# Altium footprint library Universal components.PcbLib: 101 footprints (part 3 of 7)
Each footprint in its own frame and in the unit in brackets; x right, y up, seen from the top. Pads: shape width x height; smd on the part's side, far side on the other; paste and mask are expansions set on the pad; w line width, h text height; cw(c..) or ccw(c..) is an arc to the next point about the centre after c.
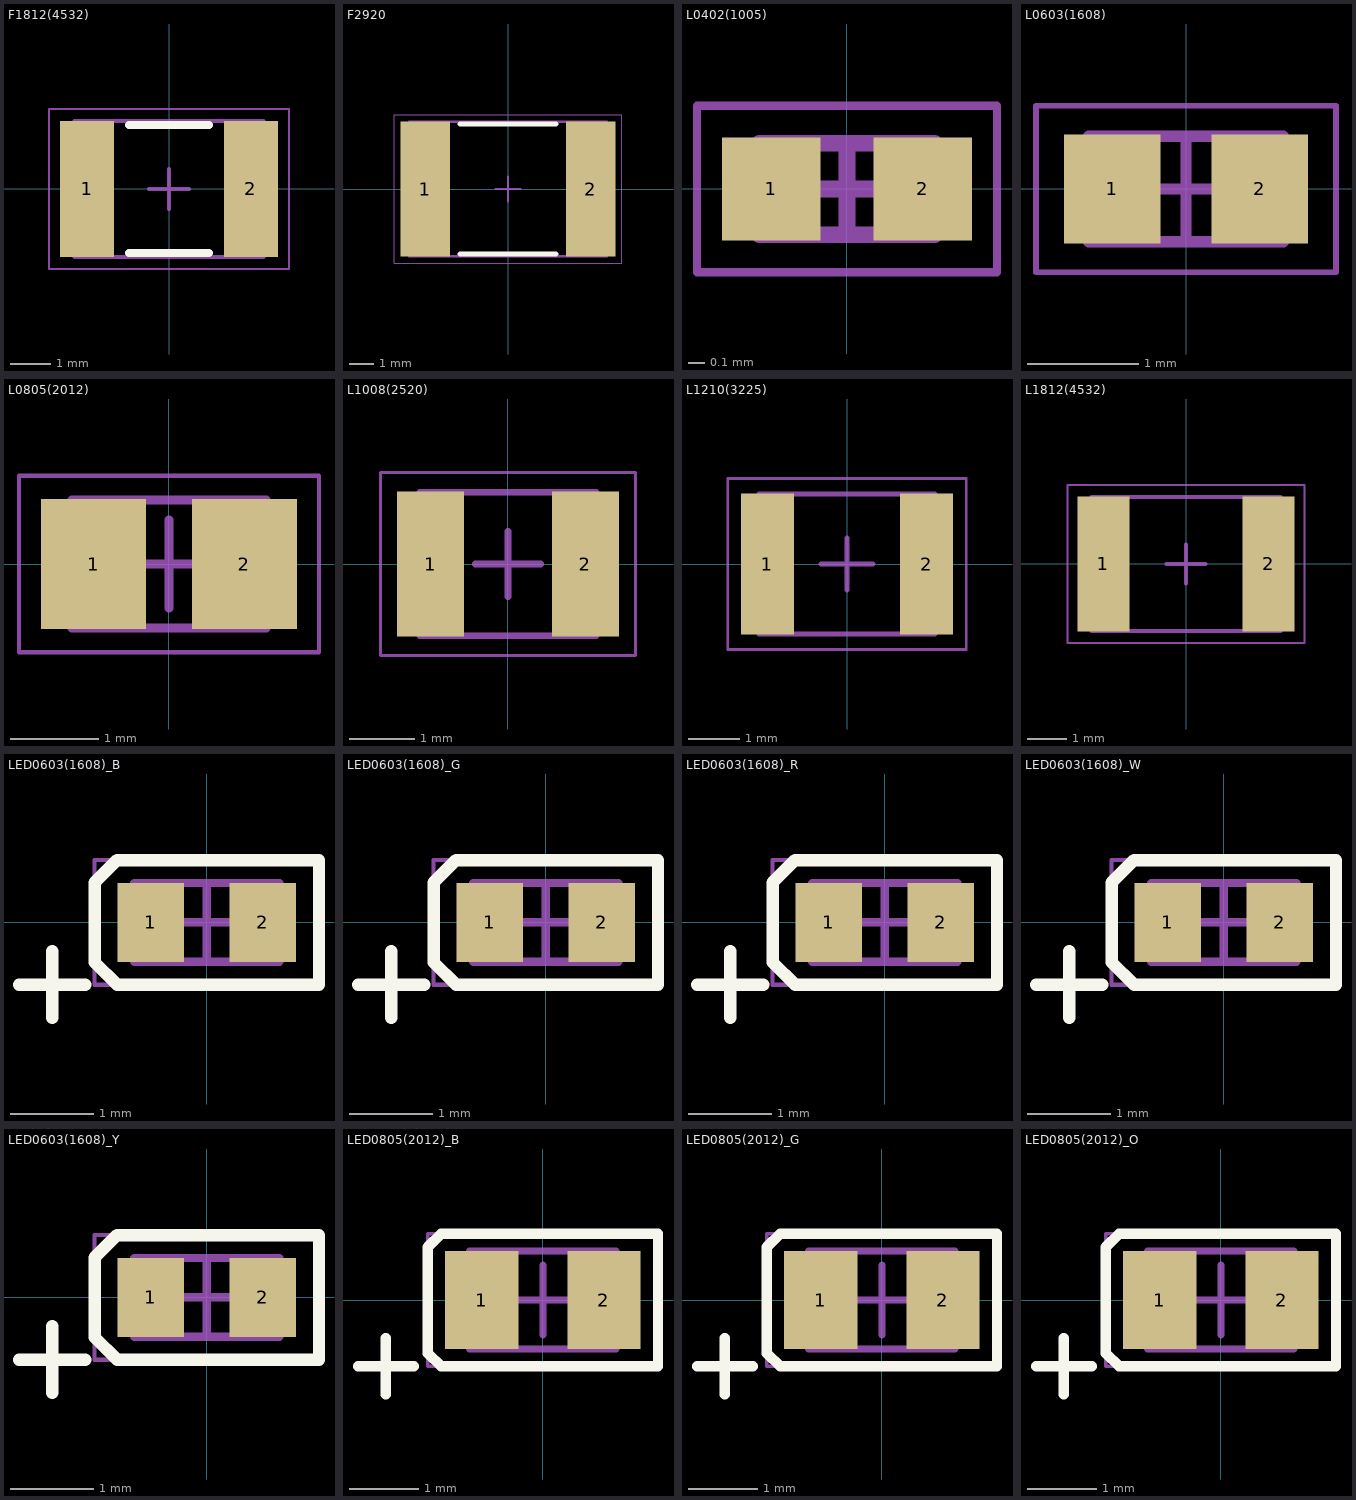
[diagram p2: the footprints below, top view; thin cyan lines are the x and y axes]

## F1812(4532) [mm] "Chip Fuse, 2-Leads, Body 4.55x3.24mm, IPC Medium Density"
height 1.2
pads (2):
  rect 1.35x3.4 smd: 1(-2.05,0) 2(2.05,0)
Top Overlay:
  lines w0.2: -1,-1.6 1,-1.6 ; -1,1.6 1,1.6
Mechanical 13:
  lines w0.1: -2.365,-1.705 2.365,-1.705 2.365,1.705 -2.365,1.705 -2.365,-1.705
Mechanical 15:
  lines w0.05: -3,-2 3,-2 3,2 -3,2 -3,-2
  lines w0.1: -0.5,0 0.5,0 ; 0,-0.5 0,0.5
3D body "User Library-Fuse 1812.step": height 1.03, standoff 0, extent -2.365,-1.74 2.37,1.74

## F2920 [mm] "Chip Fuse, 2-Leads, Body 7.36x5.12mm, IPC Medium Density"
height 1.2
pads (2):
  rect 2x5.45 smd: 1(-3.35,0) 2(3.35,0)
Top Overlay:
  lines w0.2: -1.95,-2.625 1.95,-2.625 ; -1.95,2.625 1.95,2.625
Mechanical 13:
  lines w0.1: -3.99,-2.72 3.99,-2.72 3.99,2.72 -3.99,2.72 -3.99,-2.72
Mechanical 15:
  lines w0.05: -4.6,-3 4.6,-3 4.6,3 -4.6,3 -4.6,-3
  lines w0.1: -0.5,0 0.5,0 ; 0,-0.5 0,0.5
3D body "User Library-0ZCF0200AF2C.step": height 0.8, standoff 0, extent -3.99,-2.72 3.99,2.72

## L0402(1005) [mm] "Chip Inductor, 2-Leads, Body 1.00x0.50mm, IPC Medium Density"
height 0.55
pads (2):
  rect 0.59x0.62 smd: 1(-0.455,0) 2(0.455,0)
Mechanical 13:
  lines w0.1: -0.525,-0.275 -0.525,0.275 0.525,0.275 0.525,-0.275 -0.525,-0.275
Mechanical 15:
  lines w0.05: -0.9,-0.5 -0.9,0.5 0.9,0.5 0.9,-0.5 -0.9,-0.5
  lines w0.1: -0.275,0 0.275,0 ; 0,-0.275 0,0.275
3D body "User Library-Chip InductorINDC1005X60N.STEP": height 0.6, standoff 0, extent -0.5,-0.25 0.5,0.25

## L0603(1608) [mm] "Chip Inductor, 2-Leads, Body 1.60x0.80mm, IPC Medium Density"
height 0.65
pads (2):
  rect 0.87x0.98 smd: 1(-0.665,0) 2(0.665,0)
Mechanical 13:
  lines w0.1: -0.875,-0.475 0.875,-0.475 0.875,0.475 -0.875,0.475 -0.875,-0.475
Mechanical 15:
  lines w0.05: -1.35,-0.75 1.35,-0.75 1.35,0.75 -1.35,0.75 -1.35,-0.75
  lines w0.1: -0.475,0 0.475,0 ; 0,-0.475 0,0.475
3D body "User Library-Chip InductorINDC1608X95N.STEP": height 0.95, standoff 0, extent -0.8,-0.4 0.8,0.4

## L0805(2012) [mm] "Chip Inductor, 2-Leads, Body 2.00x1.25mm, IPC Medium Density"
height 1.45
pads (2):
  rect 1.19x1.47 smd: 1(-0.855,0) 2(0.855,0)
Mechanical 13:
  lines w0.1: -1.1,-0.725 -1.1,0.725 1.1,0.725 1.1,-0.725 -1.1,-0.725
Mechanical 15:
  lines w0.05: -1.7,-1 -1.7,1 1.7,1 1.7,-1 -1.7,-1
  lines w0.1: -0.5,0 0.5,0 ; 0,-0.5 0,0.5
3D body "User Library-Chip InductorINDC2012X130N.STEP": height 1.3, standoff 0, extent -1,-0.6 1,0.6

## L1008(2520) [mm] "Chip Inductor, 2-Leads, Body 2.50x2.00mm, IPC Medium Density"
height 1.7
pads (2):
  rect 1.03x2.22 smd: 1(-1.185,0) 2(1.185,0)
Mechanical 13:
  lines w0.1: -1.35,-1.1 -1.35,1.1 1.35,1.1 1.35,-1.1 -1.35,-1.1
Mechanical 15:
  lines w0.05: -1.95,-1.4 -1.95,1.4 1.95,1.4 1.95,-1.4 -1.95,-1.4
  lines w0.1: -0.5,0 0.5,0 ; 0,-0.5 0,0.5
3D body "User Library-Chip InductorINDC2520X220N.STEP": height 2.2, standoff 0, extent -1.25,-1 1.25,1

## L1210(3225) [mm] "Chip Inductor, 2-Leads, Body 3.20x2.50mm, IPC Medium Density"
height 2.4
pads (2):
  rect 1.03x2.72 smd: 1(-1.535,0) 2(1.535,0)
Mechanical 13:
  lines w0.1: -1.7,-1.35 -1.7,1.35 1.7,1.35 1.7,-1.35 -1.7,-1.35
Mechanical 15:
  lines w0.05: -2.3,-1.65 -2.3,1.65 2.3,1.65 2.3,-1.65 -2.3,-1.65
  lines w0.1: -0.5,0 0.5,0 ; 0,-0.5 0,0.5
3D body "User Library-Chip InductorINDC3225X135N.STEP": height 1.35, standoff 0, extent -1.6,-1.25 1.6,1.25

## L1812(4532) [mm] "Chip Inductor, 2-Leads, Body 4.50x3.20mm, IPC Medium Density"
height 3.4
pads (2):
  rect 1.32x3.42 smd: 1(-2.095,0) 2(2.095,0)
Mechanical 13:
  lines w0.1: -2.4,-1.7 2.4,-1.7 2.4,1.7 -2.4,1.7 -2.4,-1.7
Mechanical 15:
  lines w0.05: -3,-2 3,-2 3,2 -3,2 -3,-2
  lines w0.1: -0.5,0 0.5,0 ; 0,-0.5 0,0.5
3D body "User Library-Chip InductorINDC4532X175N1.STEP": height 1.75, standoff 0, extent -2.25,-1.6 2.25,1.6

## LED0603(1608)_B [mm] "Chip Resistor, 2-Leads, Body 1.60x0.80mm, IPC Medium Density"
height 0.5
pads (2):
  rect 0.8x0.95 smd: 1(-0.675,0) 2(0.675,0)
Top Overlay:
  lines w0.15: -2.26,-0.75 -1.46,-0.75 ; -1.86,-1.15 -1.86,-0.35 ; -1.35,-0.48 -1.35,0.48 -1.08,0.75 1.35,0.75 1.35,-0.75 -1.08,-0.75 -1.35,-0.48
Mechanical 13:
  lines w0.1: -0.875,-0.475 -0.875,0.475 0.875,0.475 0.875,-0.475 -0.875,-0.475
Mechanical 15:
  lines w0.05: -1.35,-0.75 -1.35,0.75 1.35,0.75 1.35,-0.75 -1.35,-0.75
  lines w0.1: -0.475,0 0.475,0 ; 0,-0.475 0,0.475
3D body "User Library-LED_0603_B.STEP": height 0.6, standoff 0, extent -0.8,-0.4 0.8,0.4

## LED0603(1608)_G [mm] "Chip Resistor, 2-Leads, Body 1.60x0.80mm, IPC Medium Density"
height 0.5
pads (2):
  rect 0.8x0.95 smd: 1(-0.675,0) 2(0.675,0)
Top Overlay:
  lines w0.15: -2.26,-0.75 -1.46,-0.75 ; -1.86,-1.15 -1.86,-0.35 ; -1.35,-0.48 -1.35,0.48 -1.08,0.75 1.35,0.75 1.35,-0.75 -1.08,-0.75 -1.35,-0.48
Mechanical 13:
  lines w0.1: -0.875,-0.475 -0.875,0.475 0.875,0.475 0.875,-0.475 -0.875,-0.475
Mechanical 15:
  lines w0.05: -1.35,-0.75 -1.35,0.75 1.35,0.75 1.35,-0.75 -1.35,-0.75
  lines w0.1: -0.475,0 0.475,0 ; 0,-0.475 0,0.475
3D body "User Library-LED_0603_G.STEP": height 0.6, standoff 0, extent -0.8,-0.4 0.8,0.4

## LED0603(1608)_R [mm] "Chip Resistor, 2-Leads, Body 1.60x0.80mm, IPC Medium Density"
height 0.5
pads (2):
  rect 0.8x0.95 smd: 1(-0.675,0) 2(0.675,0)
Top Overlay:
  lines w0.15: -2.26,-0.75 -1.46,-0.75 ; -1.86,-1.15 -1.86,-0.35 ; -1.35,-0.48 -1.35,0.48 -1.08,0.75 1.35,0.75 1.35,-0.75 -1.08,-0.75 -1.35,-0.48
Mechanical 13:
  lines w0.1: -0.875,-0.475 -0.875,0.475 0.875,0.475 0.875,-0.475 -0.875,-0.475
Mechanical 15:
  lines w0.05: -1.35,-0.75 -1.35,0.75 1.35,0.75 1.35,-0.75 -1.35,-0.75
  lines w0.1: -0.475,0 0.475,0 ; 0,-0.475 0,0.475
3D body "User Library-LED_0603_R.STEP": height 0.6, standoff 0, extent -0.8,-0.4 0.8,0.4

## LED0603(1608)_W [mm] "Chip Resistor, 2-Leads, Body 1.60x0.80mm, IPC Medium Density"
height 0.5
pads (2):
  rect 0.8x0.95 smd: 1(-0.675,0) 2(0.675,0)
Top Overlay:
  lines w0.15: -2.26,-0.75 -1.46,-0.75 ; -1.86,-1.15 -1.86,-0.35 ; -1.35,-0.48 -1.08,-0.75 1.35,-0.75 1.35,0.75 -1.08,0.75 -1.35,0.48 -1.35,-0.48
Mechanical 13:
  lines w0.1: -0.875,-0.475 0.875,-0.475 0.875,0.475 -0.875,0.475 -0.875,-0.475
Mechanical 15:
  lines w0.05: -1.35,-0.75 1.35,-0.75 1.35,0.75 -1.35,0.75 -1.35,-0.75
  lines w0.1: -0.475,0 0.475,0 ; 0,-0.475 0,0.475
3D body "User Library-LED_0603_WS.STEP": height 0.6, standoff 0, extent -0.8,-0.4 0.8,0.4

## LED0603(1608)_Y [mm] "Chip Resistor, 2-Leads, Body 1.60x0.80mm, IPC Medium Density"
height 0.5
pads (2):
  rect 0.8x0.95 smd: 1(-0.675,0) 2(0.675,0)
Top Overlay:
  lines w0.15: -2.26,-0.75 -1.46,-0.75 ; -1.86,-1.15 -1.86,-0.35 ; -1.35,-0.48 -1.08,-0.75 1.35,-0.75 1.35,0.75 -1.08,0.75 -1.35,0.48 -1.35,-0.48
Mechanical 13:
  lines w0.1: -0.875,-0.475 0.875,-0.475 0.875,0.475 -0.875,0.475 -0.875,-0.475
Mechanical 15:
  lines w0.05: -1.35,-0.75 1.35,-0.75 1.35,0.75 -1.35,0.75 -1.35,-0.75
  lines w0.1: -0.475,0 0.475,0 ; 0,-0.475 0,0.475
3D body "User Library-LED_0603_Y.STEP": height 0.6, standoff 0, extent -0.8,-0.4 0.8,0.4

## LED0805(2012)_B [mm] "Chip Resistor, 2-Leads, Body 2.00x1.27mm, IPC Medium Density"
height 0.6
pads (2):
  rect 1.05x1.4 smd: 1(-0.875,0) 2(0.875,0)
Top Overlay:
  lines w0.15: -2.65,-0.95 -1.85,-0.95 ; -2.25,-1.35 -2.25,-0.55 ; -1.65,-0.76 -1.65,0.76 -1.46,0.95 1.65,0.95 1.65,-0.95 -1.46,-0.95 -1.65,-0.76
Mechanical 13:
  lines w0.1: -1.05,-0.7 -1.05,0.7 1.05,0.7 1.05,-0.7 -1.05,-0.7
Mechanical 15:
  lines w0.05: -1.65,-0.95 -1.65,0.95 1.65,0.95 1.65,-0.95 -1.65,-0.95
  lines w0.1: -0.5,0 0.5,0 ; 0,-0.5 0,0.5
3D body "User Library-led_0805_B.step": height 1.1, standoff 0, extent -1.01,-0.625 1.01,0.625

## LED0805(2012)_G [mm] "Chip Resistor, 2-Leads, Body 2.00x1.27mm, IPC Medium Density"
height 0.6
pads (2):
  rect 1.05x1.4 smd: 1(-0.875,0) 2(0.875,0)
Top Overlay:
  lines w0.15: -2.65,-0.95 -1.85,-0.95 ; -2.25,-1.35 -2.25,-0.55 ; -1.65,-0.76 -1.46,-0.95 1.65,-0.95 1.65,0.95 -1.46,0.95 -1.65,0.76 -1.65,-0.76
Mechanical 13:
  lines w0.1: -1.05,-0.7 1.05,-0.7 1.05,0.7 -1.05,0.7 -1.05,-0.7
Mechanical 15:
  lines w0.05: -1.65,-0.95 1.65,-0.95 1.65,0.95 -1.65,0.95 -1.65,-0.95
  lines w0.1: -0.5,0 0.5,0 ; 0,-0.5 0,0.5
3D body "User Library-led_0805LED0805_green.STEP": height 1.1, standoff 0, extent -1.01,-0.625 1.01,0.625

## LED0805(2012)_O [mm] "Chip Resistor, 2-Leads, Body 2.00x1.27mm, IPC Medium Density"
height 0.6
pads (2):
  rect 1.05x1.4 smd: 1(-0.875,0) 2(0.875,0)
Top Overlay:
  lines w0.15: -2.65,-0.95 -1.85,-0.95 ; -2.25,-1.35 -2.25,-0.55 ; -1.65,-0.76 -1.65,0.76 -1.46,0.95 1.65,0.95 1.65,-0.95 -1.46,-0.95 -1.65,-0.76
Mechanical 13:
  lines w0.1: -1.05,-0.7 -1.05,0.7 1.05,0.7 1.05,-0.7 -1.05,-0.7
Mechanical 15:
  lines w0.05: -1.65,-0.95 -1.65,0.95 1.65,0.95 1.65,-0.95 -1.65,-0.95
  lines w0.1: -0.5,0 0.5,0 ; 0,-0.5 0,0.5
3D body "User Library-led_0805_O.step": height 1.1, standoff 0, extent -1.01,-0.625 1.01,0.625